# Altium schematic symbol library Diodes - TVS.SchLib: 5379 symbols (part 7 of 35) (continued)
## ESD5V0LB-TP (continued)
TVS DIODE 5V 16V DFN1006-2; Manufacturer: Micro Commercial Co; Bidirectional Channels: 1; Capacitance @ Frequency: 80pF @ 1MHz; Current - Peak Pulse (10/1000µs): 25A (8/20µs); Power Line Protection: No; Power - Peak Pulse: 400W; Type: Zener; Voltage - Breakdown (Min): 6V; Voltage - Reverse Standoff (Typ): 5V (Max); Part Number: ESD5V0LB-TP; Applications: General Purpose; ComponentLink1Description: Datasheet; ComponentLink1URL: https://www.mccsemi.com/pdf/Products/ESD5V0LB(DFN1006-2)-A.pdf; ComponentLink2Description: DigiKey Link; ComponentLink2URL: http://digikey.com/product-detail/en/micro-commercial-co/ESD5V0LB-TP/ESD5V0LB-TPMSCT-ND/6004815; Device Package: 0402 (1006 Metric); LastUpdated: 9/2/2020 1:28:49 AM; Lifecycle Status: Active; Minimum Order: 1; Mounting Type: Surface Mount; Operating Temperature: -55°C ~ 125°C (TJ); Package / Case: 0402 (1006 Metric); Packaging: TapeAndReel; PartId: 10502; Part Status: Active; Price: 0.03; Series: -; Supplier 1: DigiKey; Supplier Part Number 1: ESD5V0LB-TPMSCT-ND; Supplier Device Package: DFN1006-2; Voltage - Clamping (Max) @ Ipp: 16V
footprint 0402
pins: 1, 2

## ESD5V0S1U02VH6327XTSA1
designator D?
TVS DIODE 5V 14.5V SC79-2; Manufacturer: Infineon Technologies; Capacitance @ Frequency: 35pF @ 1MHz; Current - Peak Pulse (10/1000µs): 5.5A (8/20µs); Power Line Protection: No; Power - Peak Pulse: 66W; Type: Zener; Unidirectional Channels: 1; Voltage - Breakdown (Min): 5.7V; Voltage - Clamping (Max) @ Ipp: 14.5V (Typ); Voltage - Reverse Standoff (Typ): 5V (Max); Part Number: ESD5V0S1U02VH6327XTSA1; Applications: General Purpose; ComponentLink1Description: Datasheet; ComponentLink1URL: //media.digikey.com/pdf/Data%20Sheets/Infineon%20PDFs/ESD5V0S1U-02V.pdf; ComponentLink2Description: DigiKey Link; ComponentLink2URL: http://digikey.com/product-detail/en/infineon-technologies/ESD5V0S1U02VH6327XTSA1/ESD5V0S1U02VH6327XTSA1CT-ND/8416917; LastUpdated: 9/2/2020 1:28:24 AM; Lifecycle Status: Active; Minimum Order: 1; Mounting Type: Surface Mount; Operating Temperature: -55°C ~ 125°C (TJ); Package / Case: SC-79, SOD-523; Packaging: TapeAndReel; PartId: 9784; Part Status: Active; Price: 0.06; Series: -; Supplier 1: DigiKey; Supplier Part Number 1: ESD5V0S1U02VH6327XTSA1CT-ND; Supplier Device Package: PG-SC79-2
footprint SOD523F
pins: 1, 2

## ESD5Z2.5T1G
designator D?
TVS DIODE 2.5V 10.9V SOD523; Manufacturer: ON Semiconductor; Capacitance @ Frequency: 145pF @ 1MHz; Current - Peak Pulse (10/1000µs): 11A (8/20µs); Power Line Protection: No; Power - Peak Pulse: 120W; Type: Zener; Unidirectional Channels: 1; Voltage - Breakdown (Min): 4V; Voltage - Reverse Standoff (Typ): 2.5V (Max); Part Number: ESD5Z2.5T1G; Applications: General Purpose; ComponentLink1Description: Datasheet; ComponentLink1URL: https://www.onsemi.com/pub/Collateral/ESD5Z2.5T1-D.PDF; ComponentLink2Description: DigiKey Link; ComponentLink2URL: http://digikey.com/product-detail/en/on-semiconductor/ESD5Z2.5T1G/ESD5Z2.5T1GOSCT-ND/1967043; LastUpdated: 9/2/2020 1:28:24 AM; Lifecycle Status: Active; Minimum Order: 1; Mounting Type: Surface Mount; Operating Temperature: -55°C ~ 150°C (TJ); Package / Case: SC-79, SOD-523; Packaging: TapeAndReel; PartId: 9809; Part Status: Active; Price: 0.03; Series: -; Supplier 1: DigiKey; Supplier Part Number 1: ESD5Z2.5T1GOSCT-ND; Supplier Device Package: SOD-523; Voltage - Clamping (Max) @ Ipp: 10.9V
footprint SOD523F
pins: 1, 2

## ESD5Z2.5T5G
designator D?
TVS DIODE 2.5V 10.9V SOD523; Manufacturer: ON Semiconductor; Capacitance @ Frequency: 145pF @ 1MHz; Current - Peak Pulse (10/1000µs): 11A (8/20µs); Power Line Protection: No; Power - Peak Pulse: 120W; Type: Zener; Unidirectional Channels: 1; Voltage - Breakdown (Min): 4V; Voltage - Reverse Standoff (Typ): 2.5V (Max); Part Number: ESD5Z2.5T5G; Applications: General Purpose; ComponentLink1Description: Datasheet; ComponentLink1URL: https://www.onsemi.com/pub/Collateral/ESD5Z2.5T1-D.PDF; ComponentLink2Description: DigiKey Link; ComponentLink2URL: http://digikey.com/product-detail/en/on-semiconductor/ESD5Z2.5T5G/ESD5Z2.5T5GOSCT-ND/9086484; LastUpdated: 9/2/2020 1:28:24 AM; Lifecycle Status: Active; Minimum Order: 1; Mounting Type: Surface Mount; Operating Temperature: -55°C ~ 150°C (TJ); Package / Case: SC-79, SOD-523; Packaging: TapeAndReel; PartId: 9792; Part Status: Active; Price: 0.03; Series: -; Supplier 1: DigiKey; Supplier Part Number 1: ESD5Z2.5T5GOSCT-ND; Supplier Device Package: SOD-523; Voltage - Clamping (Max) @ Ipp: 10.9V
footprint SOD523F
pins: 1, 2

## ESD5Z3.3T1G
designator D?
TVS DIODE 3.3V 14.1V SOD523; Manufacturer: ON Semiconductor; Capacitance @ Frequency: 105pF @ 1MHz; Current - Peak Pulse (10/1000µs): 11.2A (8/20µs); Power Line Protection: No; Power - Peak Pulse: 158W; Type: Zener; Unidirectional Channels: 1; Voltage - Breakdown (Min): 5V; Voltage - Reverse Standoff (Typ): 3.3V (Max); Part Number: ESD5Z3.3T1G; Applications: General Purpose; ComponentLink1Description: Datasheet; ComponentLink1URL: https://www.onsemi.com/pub/Collateral/ESD5Z2.5T1-D.PDF; ComponentLink2Description: DigiKey Link; ComponentLink2URL: http://digikey.com/product-detail/en/on-semiconductor/ESD5Z3.3T1G/ESD5Z3.3T1GOSCT-ND/1967044; LastUpdated: 9/2/2020 1:28:24 AM; Lifecycle Status: Active; Minimum Order: 1; Mounting Type: Surface Mount; Operating Temperature: -55°C ~ 150°C (TJ); Package / Case: SC-79, SOD-523; Packaging: TapeAndReel; PartId: 9754; Part Status: Active; Price: 0.04; Series: -; Supplier 1: DigiKey; Supplier Part Number 1: ESD5Z3.3T1GOSCT-ND; Supplier Device Package: SOD-523; Voltage - Clamping (Max) @ Ipp: 14.1V
footprint SOD523F
pins: 1, 2

## ESD5Z3.3T5G
designator D?
TVS DIODE 3.3VWM 14.1VC SOD523; Manufacturer: ON Semiconductor; Capacitance @ Frequency: 105pF @ 1MHz; Current - Peak Pulse (10/1000µs): 11.2A (8/20µs); Power Line Protection: No; Power - Peak Pulse: 158W; Type: Zener; Unidirectional Channels: 1; Voltage - Breakdown (Min): 5V; Voltage - Clamping (Max) @ Ipp: 14.1V; Voltage - Reverse Standoff (Typ): 3.3V (Max); Part Number: ESD5Z3.3T5G; Applications: General Purpose; ComponentLink1Description: Datasheet; ComponentLink1URL: https://www.onsemi.com/pub/Collateral/ESD5Z2.5T1-D.PDF; ComponentLink2Description: DigiKey Link; ComponentLink2URL: http://digikey.com/product-detail/en/on-semiconductor/ESD5Z3.3T5G/ESD5Z3.3T5GOSCT-ND/8538421; LastUpdated: 9/2/2020 1:28:24 AM; Lifecycle Status: Active; Minimum Order: 1; Mounting Type: Surface Mount; Operating Temperature: -55°C ~ 150°C (TJ); Package / Case: SC-79, SOD-523; Packaging: TapeAndReel; PartId: 9806; Part Status: Active; Price: 0.03; Series: -; Supplier 1: DigiKey; Supplier Part Number 1: ESD5Z3.3T5GOSCT-ND; Supplier Device Package: SOD-523
footprint SOD523F
pins: 1, 2

## ESD5Z5.0T1G
designator D?
TVS DIODE 5V 18.6V SOD523; Manufacturer: ON Semiconductor; Capacitance @ Frequency: 80pF @ 1MHz; Current - Peak Pulse (10/1000µs): 9.4A (8/20µs); Power Line Protection: No; Power - Peak Pulse: 174W; Type: Zener; Unidirectional Channels: 1; Voltage - Breakdown (Min): 6.2V; Voltage - Reverse Standoff (Typ): 5V (Max); Part Number: ESD5Z5.0T1G; Applications: General Purpose; ComponentLink1Description: Datasheet; ComponentLink1URL: https://www.onsemi.com/pub/Collateral/ESD5Z2.5T1-D.PDF; ComponentLink2Description: DigiKey Link; ComponentLink2URL: http://digikey.com/product-detail/en/on-semiconductor/ESD5Z5.0T1G/ESD5Z5.0T1GOSCT-ND/1967045; LastUpdated: 9/2/2020 1:28:24 AM; Lifecycle Status: Active; Minimum Order: 1; Mounting Type: Surface Mount; Operating Temperature: -55°C ~ 150°C (TJ); Package / Case: SC-79, SOD-523; Packaging: TapeAndReel; PartId: 9755; Part Status: Active; Price: 0.04; Series: -; Supplier 1: DigiKey; Supplier Part Number 1: ESD5Z5.0T1GOSCT-ND; Supplier Device Package: SOD-523; Voltage - Clamping (Max) @ Ipp: 18.6V
footprint SOD523F
pins: 1, 2

## ESD5Z5.0T5G
designator D?
TVS DIODE 5V 18.6V SOD523; Manufacturer: ON Semiconductor; Capacitance @ Frequency: 80pF @ 1MHz; Current - Peak Pulse (10/1000µs): 9.4A (8/20µs); Power Line Protection: No; Power - Peak Pulse: 174W; Type: Zener; Unidirectional Channels: 1; Voltage - Breakdown (Min): 6.2V; Voltage - Reverse Standoff (Typ): 5V (Max); Part Number: ESD5Z5.0T5G; Applications: General Purpose; ComponentLink1Description: Datasheet; ComponentLink1URL: https://www.onsemi.com/pub/Collateral/ESD5Z2.5T1-D.PDF; ComponentLink2Description: DigiKey Link; ComponentLink2URL: http://digikey.com/product-detail/en/on-semiconductor/ESD5Z5.0T5G/ESD5Z5.0T5GOSCT-ND/9086485; LastUpdated: 9/2/2020 1:28:24 AM; Lifecycle Status: Active; Minimum Order: 1; Mounting Type: Surface Mount; Operating Temperature: -55°C ~ 150°C (TJ); Package / Case: SC-79, SOD-523; Packaging: TapeAndReel; PartId: 9791; Part Status: Active; Price: 0.03; Series: -; Supplier 1: DigiKey; Supplier Part Number 1: ESD5Z5.0T5GOSCT-ND; Supplier Device Package: SOD-523; Voltage - Clamping (Max) @ Ipp: 18.6V
footprint SOD523F
pins: 1, 2

## ESD5Z6.0T1G
designator D?
TVS DIODE 6V 20.5V SOD523; Manufacturer: ON Semiconductor; Capacitance @ Frequency: 70pF @ 1MHz; Current - Peak Pulse (10/1000µs): 8.8A (8/20µs); Power Line Protection: No; Power - Peak Pulse: 181W; Type: Zener; Unidirectional Channels: 1; Voltage - Breakdown (Min): 6.8V; Voltage - Reverse Standoff (Typ): 6V (Max); Part Number: ESD5Z6.0T1G; Applications: General Purpose; ComponentLink1Description: Datasheet; ComponentLink1URL: https://www.onsemi.com/pub/Collateral/ESD5Z2.5T1-D.PDF; ComponentLink2Description: DigiKey Link; ComponentLink2URL: http://digikey.com/product-detail/en/on-semiconductor/ESD5Z6.0T1G/ESD5Z6.0T1GOSCT-ND/1967046; LastUpdated: 9/2/2020 1:28:24 AM; Lifecycle Status: Active; Minimum Order: 1; Mounting Type: Surface Mount; Operating Temperature: -55°C ~ 150°C (TJ); Package / Case: SC-79, SOD-523; Packaging: TapeAndReel; PartId: 9804; Part Status: Active; Price: 0.04; Series: -; Supplier 1: DigiKey; Supplier Part Number 1: ESD5Z6.0T1GOSCT-ND; Supplier Device Package: SOD-523; Voltage - Clamping (Max) @ Ipp: 20.5V
footprint SOD523F
pins: 1, 2

## ESD5Z6.0T5G
designator D?
TVS DIODE 6V 20.5V SOD523; Manufacturer: ON Semiconductor; Capacitance @ Frequency: 70pF @ 1MHz; Current - Peak Pulse (10/1000µs): 8.8A (8/20µs); Power Line Protection: No; Power - Peak Pulse: 181W; Type: Zener; Unidirectional Channels: 1; Voltage - Breakdown (Min): 6.8V; Voltage - Reverse Standoff (Typ): 6V (Max); Part Number: ESD5Z6.0T5G; Applications: General Purpose; ComponentLink1Description: Datasheet; ComponentLink1URL: https://www.onsemi.com/pub/Collateral/ESD5Z2.5T1-D.PDF; ComponentLink2Description: DigiKey Link; ComponentLink2URL: http://digikey.com/product-detail/en/on-semiconductor/ESD5Z6.0T5G/ESD5Z6.0T5GOSCT-ND/9086486; LastUpdated: 9/2/2020 1:28:24 AM; Lifecycle Status: Active; Minimum Order: 1; Mounting Type: Surface Mount; Operating Temperature: -55°C ~ 150°C (TJ); Package / Case: SC-79, SOD-523; Packaging: TapeAndReel; PartId: 9807; Part Status: Active; Price: 0.03; Series: -; Supplier 1: DigiKey; Supplier Part Number 1: ESD5Z6.0T5GOSCT-ND; Supplier Device Package: SOD-523; Voltage - Clamping (Max) @ Ipp: 20.5V
footprint SOD523F
pins: 1, 2

## ESD5Z7.0T1G
designator D?
TVS DIODE 7V 22.7V SOD523; Manufacturer: ON Semiconductor; Capacitance @ Frequency: 65pF @ 1MHz; Current - Peak Pulse (10/1000µs): 8.8A (8/20µs); Power Line Protection: No; Power - Peak Pulse: 200W; Type: Zener; Unidirectional Channels: 1; Voltage - Breakdown (Min): 7.5V; Voltage - Reverse Standoff (Typ): 7V (Max); Part Number: ESD5Z7.0T1G; Applications: General Purpose; ComponentLink1Description: Datasheet; ComponentLink1URL: https://www.onsemi.com/pub/Collateral/ESD5Z2.5T1-D.PDF; ComponentLink2Description: DigiKey Link; ComponentLink2URL: http://digikey.com/product-detail/en/on-semiconductor/ESD5Z7.0T1G/ESD5Z7.0T1GOSCT-ND/2120622; LastUpdated: 9/2/2020 1:28:24 AM; Lifecycle Status: Active; Minimum Order: 1; Mounting Type: Surface Mount; Operating Temperature: -55°C ~ 150°C (TJ); Package / Case: SC-79, SOD-523; Packaging: TapeAndReel; PartId: 9808; Part Status: Active; Price: 0.03; Series: -; Supplier 1: DigiKey; Supplier Part Number 1: ESD5Z7.0T1GOSCT-ND; Supplier Device Package: SOD-523; Voltage - Clamping (Max) @ Ipp: 22.7V
footprint SOD523F
pins: 1, 2

## ESD5Z7.0T5G
designator D?
TVS DIODE 7V 22.7V SOD523; Manufacturer: ON Semiconductor; Capacitance @ Frequency: 65pF @ 1MHz; Current - Peak Pulse (10/1000µs): 8.8A (8/20µs); Power Line Protection: No; Power - Peak Pulse: 200W; Type: Zener; Unidirectional Channels: 1; Voltage - Breakdown (Min): 7.5V; Voltage - Reverse Standoff (Typ): 7V (Max); Part Number: ESD5Z7.0T5G; Applications: General Purpose; ComponentLink1Description: Datasheet; ComponentLink1URL: https://www.onsemi.com/pub/Collateral/ESD5Z2.5T1-D.PDF; ComponentLink2Description: DigiKey Link; ComponentLink2URL: http://digikey.com/product-detail/en/on-semiconductor/ESD5Z7.0T5G/ESD5Z7.0T5GOSCT-ND/9086487; LastUpdated: 9/2/2020 1:28:24 AM; Lifecycle Status: Active; Minimum Order: 1; Mounting Type: Surface Mount; Operating Temperature: -55°C ~ 150°C (TJ); Package / Case: SC-79, SOD-523; Packaging: CutTape; PartId: 9801; Part Status: Active; Price: 0.37; Series: -; Supplier 1: DigiKey; Supplier Part Number 1: ESD5Z7.0T5GOSCT-ND; Supplier Device Package: SOD-523; Voltage - Clamping (Max) @ Ipp: 22.7V
footprint SOD523F
pins: 1, 2

## ESD5Z12T1G
designator D?
TVS DIODE 12V 25V SOD523; Manufacturer: ON Semiconductor; Capacitance @ Frequency: 55pF @ 1MHz; Current - Peak Pulse (10/1000µs): 9.6A (8/20µs); Power Line Protection: No; Power - Peak Pulse: 240W; Type: Zener; Unidirectional Channels: 1; Voltage - Breakdown (Min): 14.1V; Voltage - Reverse Standoff (Typ): 12V (Max); Part Number: ESD5Z12T1G; Applications: General Purpose; ComponentLink1Description: Datasheet; ComponentLink1URL: https://www.onsemi.com/pub/Collateral/ESD5Z2.5T1-D.PDF; ComponentLink2Description: DigiKey Link; ComponentLink2URL: http://digikey.com/product-detail/en/on-semiconductor/ESD5Z12T1G/ESD5Z12T1GOSCT-ND/2120621; LastUpdated: 9/2/2020 1:28:24 AM; Lifecycle Status: Active; Minimum Order: 1; Mounting Type: Surface Mount; Operating Temperature: -55°C ~ 150°C (TJ); Package / Case: SC-79, SOD-523; Packaging: TapeAndReel; PartId: 9805; Part Status: Active; Price: 0.04; Series: -; Supplier 1: DigiKey; Supplier Part Number 1: ESD5Z12T1GOSCT-ND; Supplier Device Package: SOD-523; Voltage - Clamping (Max) @ Ipp: 25V
footprint SOD523F
pins: 1, 2

## ESD5Z12T5G
designator D?
TVS DIODE 12V 25V SOD523; Manufacturer: ON Semiconductor; Capacitance @ Frequency: 55pF @ 1MHz; Current - Peak Pulse (10/1000µs): 9.6A (8/20µs); Power Line Protection: No; Power - Peak Pulse: 240W; Type: Zener; Unidirectional Channels: 1; Voltage - Breakdown (Min): 14.1V; Voltage - Reverse Standoff (Typ): 12V (Max); Part Number: ESD5Z12T5G; Applications: General Purpose; ComponentLink1Description: Datasheet; ComponentLink1URL: https://www.onsemi.com/pub/Collateral/ESD5Z2.5T1-D.PDF; ComponentLink2Description: DigiKey Link; ComponentLink2URL: http://digikey.com/product-detail/en/on-semiconductor/ESD5Z12T5G/ESD5Z12T5GOSCT-ND/9086483; LastUpdated: 9/2/2020 1:28:23 AM; Lifecycle Status: Active; Minimum Order: 1; Mounting Type: Surface Mount; Operating Temperature: -55°C ~ 150°C (TJ); Package / Case: SC-79, SOD-523; Packaging: TapeAndReel; PartId: 9722; Part Status: Active; Price: 0.03; Series: -; Supplier 1: DigiKey; Supplier Part Number 1: ESD5Z12T5GOSCT-ND; Supplier Device Package: SOD-523; Voltage - Clamping (Max) @ Ipp: 25V
footprint SOD523F
pins: 1, 2

## ESD7V0D5-TP
designator D?
TVS DIODE 7V 22.7V SOD523; Manufacturer: Micro Commercial Co; Capacitance @ Frequency: 65pF @ 1MHz; Current - Peak Pulse (10/1000µs): 8.8A (8/20µs); Power Line Protection: No; Power - Peak Pulse: 200W; Type: Zener; Unidirectional Channels: 1; Voltage - Breakdown (Min): 7.5V; Voltage - Reverse Standoff (Typ): 7V (Max); Part Number: ESD7V0D5-TP; Applications: General Purpose; ComponentLink1Description: Datasheet; ComponentLink1URL: https://www.mccsemi.com/pdf/Products/ESD3V3D5-ESD12VD5(SOD-523).pdf; ComponentLink2Description: DigiKey Link; ComponentLink2URL: http://digikey.com/product-detail/en/micro-commercial-co/ESD7V0D5-TP/ESD7V0D5-TPMSCT-ND/1777010; LastUpdated: 9/2/2020 1:28:24 AM; Lifecycle Status: Active; Minimum Order: 1; Mounting Type: Surface Mount; Operating Temperature: -55°C ~ 150°C (TJ); Package / Case: SC-79, SOD-523; Packaging: TapeAndReel; PartId: 9781; Part Status: Active; Price: 0.06; Series: -; Supplier 1: DigiKey; Supplier Part Number 1: ESD7V0D5-TPMSCT-ND; Supplier Device Package: SOD-523; Voltage - Clamping (Max) @ Ipp: 22.7V
footprint SOD523F
pins: 1, 2

## ESD12VD3-TP
designator D?
TVS DIODE 12V 33V SOD323; Manufacturer: Micro Commercial Co; Capacitance @ Frequency: 150pF @ 1MHz; Current - Peak Pulse (10/1000µs): 15A (8/20µs); Power Line Protection: No; Power - Peak Pulse: 350W; Type: Zener; Unidirectional Channels: 1; Voltage - Breakdown (Min): 13.3V; Voltage - Reverse Standoff (Typ): 12V (Max); Part Number: ESD12VD3-TP; Applications: General Purpose; ComponentLink1Description: Datasheet; ComponentLink1URL: https://www.mccsemi.com/pdf/Products/ESD5V0D3-ESD12VD3(SOD-323).pdf; ComponentLink2Description: DigiKey Link; ComponentLink2URL: http://digikey.com/product-detail/en/micro-commercial-co/ESD12VD3-TP/ESD12VD3-TPMSCT-ND/1923301; LastUpdated: 9/2/2020 1:28:27 AM; Lifecycle Status: Active; Minimum Order: 1; Mounting Type: Surface Mount; Operating Temperature: -55°C ~ 150°C (TJ); Package / Case: SC-76, SOD-323; Packaging: TapeAndReel; PartId: 9880; Part Status: Active; Price: 0.06; Series: -; Supplier 1: DigiKey; Supplier Part Number 1: ESD12VD3-TPMSCT-ND; Supplier Device Package: SOD-323; Voltage - Clamping (Max) @ Ipp: 33V
footprint SOD323
pins: 1, 2

## ESD12VD3B-TP
designator D?
TVS DIODE 12V 15.5V SOD323; Manufacturer: Micro Commercial Co; Bidirectional Channels: 1; Capacitance @ Frequency: 80pF @ 1MHz; Current - Peak Pulse (10/1000µs): 1A (8/20µs); Power Line Protection: No; Power - Peak Pulse: 350W; Type: Zener; Voltage - Breakdown (Min): 13.5V; Voltage - Reverse Standoff (Typ): 12V (Max); Part Number: ESD12VD3B-TP; Applications: General Purpose; ComponentLink1Description: Datasheet; ComponentLink1URL: https://www.mccsemi.com/pdf/Products/ESD12VD3B(SOD-323).pdf; ComponentLink2Description: DigiKey Link; ComponentLink2URL: http://digikey.com/product-detail/en/micro-commercial-co/ESD12VD3B-TP/ESD12VD3B-TPMSCT-ND/2783889; LastUpdated: 9/2/2020 1:28:29 AM; Lifecycle Status: Active; Minimum Order: 1; Mounting Type: Surface Mount; Operating Temperature: -55°C ~ 150°C (TJ); Package / Case: SC-76, SOD-323; Packaging: TapeAndReel; PartId: 9922; Part Status: Active; Price: 0.11; Series: -; Supplier 1: DigiKey; Supplier Part Number 1: ESD12VD3B-TPMSCT-ND; Supplier Device Package: SOD-323; Voltage - Clamping (Max) @ Ipp: 15.5V
footprint SOD323
pins: 1, 2

## ESD12VD5-TP
designator D?
TVS DIODE 12V 25V SOD523; Manufacturer: Micro Commercial Co; Capacitance @ Frequency: 55pF @ 1MHz; Current - Peak Pulse (10/1000µs): 9.6A (8/20µs); Power Line Protection: No; Power - Peak Pulse: 240W; Type: Zener; Unidirectional Channels: 1; Voltage - Breakdown (Min): 14.1V; Voltage - Reverse Standoff (Typ): 12V (Max); Part Number: ESD12VD5-TP; Applications: General Purpose; ComponentLink1Description: Datasheet; ComponentLink1URL: https://www.mccsemi.com/pdf/Products/ESD3V3D5-ESD12VD5(SOD-523).pdf; ComponentLink2Description: DigiKey Link; ComponentLink2URL: http://digikey.com/product-detail/en/micro-commercial-co/ESD12VD5-TP/ESD12VD5-TPMSCT-ND/1777012; LastUpdated: 9/2/2020 1:28:24 AM; Lifecycle Status: Active; Minimum Order: 1; Mounting Type: Surface Mount; Operating Temperature: -55°C ~ 150°C (TJ); Package / Case: SC-79, SOD-523; Packaging: TapeAndReel; PartId: 9780; Part Status: Active; Price: 0.06; Series: -; Supplier 1: DigiKey; Supplier Part Number 1: ESD12VD5-TPMSCT-ND; Supplier Device Package: SOD-523; Voltage - Clamping (Max) @ Ipp: 25V
footprint SOD523F
pins: 1, 2

## ESD24VD5-TP
designator D?
ESDPROTECTIONDEVICESSOD-523; Manufacturer: Micro Commercial Co; Capacitance @ Frequency: 36pF @ 1MHz; Current - Peak Pulse (10/1000µs): 7.5A (8/20µs); Power Line Protection: No; Power - Peak Pulse: 330W; Type: Zener; Unidirectional Channels: 1; Voltage - Breakdown (Min): 26.7V; Voltage - Clamping (Max) @ Ipp: 44V; Voltage - Reverse Standoff (Typ): 24V (Max); Part Number: ESD24VD5-TP; Applications: General Purpose; ComponentLink1Description: Datasheet; ComponentLink1URL: https://www.mccsemi.com/pdf/Products/ESD24VD5(SOD-523)-V1.pdf; ComponentLink2Description: DigiKey Link; ComponentLink2URL: http://digikey.com/product-detail/en/micro-commercial-co/ESD24VD5-TP/ESD24VD5-TPMSCT-ND/10054349; LastUpdated: 9/2/2020 1:28:24 AM; Lifecycle Status: Active; Minimum Order: 1; Mounting Type: Surface Mount; Operating Temperature: -55°C ~ 150°C (TJ); Package / Case: SC-79, SOD-523; Packaging: TapeAndReel; PartId: 9798; Part Status: Active; Price: 0.07; Series: -; Supplier 1: DigiKey; Supplier Part Number 1: ESD24VD5-TPMSCT-ND; Supplier Device Package: SOD-523
footprint SOD523F
pins: 1, 2

## ESD24VLB-TP
designator D?
VARISTOR 24V DFN1006-2; Manufacturer: Micro Commercial Co; Bidirectional Channels: 1; Capacitance @ Frequency: 20pF @ 1MHz (Max); Current - Peak Pulse (10/1000µs): 5A (8/20µs); Power Line Protection: No; Power - Peak Pulse: 300W; Type: Zener; Voltage - Breakdown (Min): 27V; Voltage - Clamping (Max) @ Ipp: 40V; Voltage - Reverse Standoff (Typ): 24V (Max); Part Number: ESD24VLB-TP; Applications: General Purpose; ComponentLink1Description: Datasheet; ComponentLink1URL: https://www.mccsemi.com/pdf/Products/ESD24VLB(DFN1006-2)-V1.pdf; ComponentLink2Description: DigiKey Link; ComponentLink2URL: http://digikey.com/product-detail/en/micro-commercial-co/ESD24VLB-TP/ESD24VLB-TPMSCT-ND/10054457; Device Package: 0402 (1006 Metric); LastUpdated: 9/2/2020 1:28:49 AM; Lifecycle Status: Active; Minimum Order: 1; Mounting Type: Surface Mount; Operating Temperature: -55°C ~ 125°C (TJ); Package / Case: 0402 (1006 Metric); Packaging: TapeAndReel; PartId: 10481; Part Status: Active; Price: 0.06; Series: -; Supplier 1: DigiKey; Supplier Part Number 1: ESD24VLB-TPMSCT-ND; Supplier Device Package: DFN1006-2
footprint 0402
pins: 1, 2

## ESD133CTR
designator D?
33V STEERING DIODE,PACKAGE DFN10; Manufacturer: SMC Diode Solutions; Bidirectional Channels: 1; Capacitance @ Frequency: 12pF @ 1MHz; Current - Peak Pulse (10/1000µs): 4A (8/20µs); Power Line Protection: No; Type: Zener; Voltage - Breakdown (Min): 35V; Voltage - Clamping (Max) @ Ipp: 60V; Voltage - Reverse Standoff (Typ): 33V (Max); Part Number: ESD133CTR; Applications: General Purpose; ComponentLink1Description: Datasheet; ComponentLink1URL: http://www.smc-diodes.com/propdf/ESD133C%20N2233%20REV.B.pdf; ComponentLink2Description: DigiKey Link; ComponentLink2URL: http://digikey.com/product-detail/en/smc-diode-solutions/ESD133CTR/1655-ESD133CCT-ND/12173926; LastUpdated: 8/30/2020 9:08:11 PM; Lifecycle Status: Active; Minimum Order: 1; Mounting Type: Surface Mount; Operating Temperature: -55°C ~ 85°C (TA); Package / Case: 0402 (1006 Metric); Packaging: Unknown; PartId: 11497; Price: 0.03; Series: ESD133C; Supplier 1: DigiKey; Supplier Part Number 1: 1655-ESD133CCT-ND; Supplier Device Package: DFN1006-2L
footprint 0402
pins: 1, 2

## ESD351DPYR
designator D?
GENERAL PURPOSE ESD PROTECTION; Manufacturer: Texas Instruments; Capacitance @ Frequency: 1.8pF @ 1MHz; Current - Peak Pulse (10/1000µs): 16A; Power Line Protection: No; Power - Peak Pulse: 36W; Type: Zener; Unidirectional Channels: 1; Voltage - Breakdown (Min): 4.5V; Voltage - Clamping (Max) @ Ipp: 6.5V; Voltage - Reverse Standoff (Typ): 3.6V; Part Number: ESD351DPYR; Applications: General Purpose; ComponentLink1Description: Datasheet; ComponentLink1URL: http://www.ti.com/general/docs/suppproductinfo.tsp?distId=10&gotoUrl=http%3A%2F%2Fwww.ti.com%2Flit%2Fgpn%2Fesd351; ComponentLink2Description: DigiKey Link; ComponentLink2URL: http://digikey.com/product-detail/en/texas-instruments/ESD351DPYR/296-51109-1-ND/9745473; Device Package: 0402 (1006 Metric); LastUpdated: 9/2/2020 1:28:45 AM; Lifecycle Status: Active; Minimum Order: 1; Mounting Type: Surface Mount; Operating Temperature: -40°C ~ 125°C; Package / Case: 0402 (1006 Metric); Packaging: TapeAndReel; PartId: 10376; Part Status: Active; Price: 0.10; Series: -; Supplier 1: DigiKey; Supplier Part Number 1: 296-51109-1-ND; Supplier Device Package: 2-X1SON (1x.60)
footprint 0402
pins: 1, 2

## ESD401DPYR
designator D?
TVS DIODE 5.5V 24V 2X1SON; Manufacturer: Texas Instruments; Bidirectional Channels: 1; Current - Peak Pulse (10/1000µs): 4.5A (8/20µs); Power Line Protection: No; Power - Peak Pulse: 67W; Type: Zener; Voltage - Breakdown (Min): 7.5V; Voltage - Clamping (Max) @ Ipp: 24V (Typ); Voltage - Reverse Standoff (Typ): 5.5V (Max); Part Number: ESD401DPYR; Applications: General Purpose; ComponentLink1Description: Datasheet; ComponentLink1URL: http://www.ti.com/general/docs/suppproductinfo.tsp?distId=10&gotoUrl=http%3A%2F%2Fwww.ti.com%2Flit%2Fgpn%2Fesd401; ComponentLink2Description: DigiKey Link; ComponentLink2URL: http://digikey.com/product-detail/en/texas-instruments/ESD401DPYR/296-47160-1-ND/7650254; Device Package: 0402 (1006 Metric); LastUpdated: 9/2/2020 1:28:49 AM; Lifecycle Status: Active; Minimum Order: 1; Mounting Type: Surface Mount; Operating Temperature: -40°C ~ 125°C (TA); Package / Case: 0402 (1006 Metric); Packaging: TapeAndReel; PartId: 10459; Part Status: Active; Price: 0.12; Series: -; Supplier 1: DigiKey; Supplier Part Number 1: 296-47160-1-ND; Supplier Device Package: 2-X1SON (1x.60)
footprint 0402
pins: 1, 2

## ESD0512LB-TP
designator D?
5V, ESD PROTECTION DEVICES, DFN1; Manufacturer: Micro Commercial Co; Bidirectional Channels: 1; Capacitance @ Frequency: 30pF @ 1MHz; Current - Peak Pulse (10/1000µs): 10A (8/20µs); Power Line Protection: No; Power - Peak Pulse: 200W; Type: Zener; Voltage - Breakdown (Min): 11V; Voltage - Clamping (Max) @ Ipp: 20V (Typ); Voltage - Reverse Standoff (Typ): 5V (Max); Part Number: ESD0512LB-TP; Applications: General Purpose; ComponentLink2Description: DigiKey Link; ComponentLink2URL: http://digikey.com/product-detail/en/micro-commercial-co/ESD0512LB-TP/353-ESD0512LB-TPCT-ND/12177322; LastUpdated: 8/30/2020 9:08:11 PM; Lifecycle Status: Active; Minimum Order: 1; Mounting Type: Surface Mount; Package / Case: 0402 (1006 Metric); Packaging: Unknown; PartId: 11466; Price: 0.03; Supplier 1: DigiKey; Supplier Part Number 1: 353-ESD0512LB-TPCT-ND; Supplier Device Package: DFN1006-2
footprint 0402
pins: 1, 2

## ESD1524D3B-TP
designator D?
15V, ESD PROTECTION DEVICES, SOD; Manufacturer: Micro Commercial Co; Bidirectional Channels: 1; Capacitance @ Frequency: 13pF @ 1MHz (Max); Current - Peak Pulse (10/1000µs): 5A (8/20µs); Power Line Protection: No; Power - Peak Pulse: 160W; Type: Zener; Voltage - Breakdown (Min): 17.1V; Voltage - Clamping (Max) @ Ipp: 35V; Voltage - Reverse Standoff (Typ): 15V (Max); Part Number: ESD1524D3B-TP; Applications: General Purpose; ComponentLink2Description: DigiKey Link; ComponentLink2URL: http://digikey.com/product-detail/en/micro-commercial-co/ESD1524D3B-TP/353-ESD1524D3B-TPDKR-ND/12177326; LastUpdated: 8/30/2020 9:07:52 PM; Lifecycle Status: Active; Minimum Order: 1; Mounting Type: Surface Mount; Package / Case: SC-76, SOD-323; Packaging: Unknown; PartId: 11457; Price: 0.06; Supplier 1: DigiKey; Supplier Part Number 1: 353-ESD1524D3B-TPDKR-ND; Supplier Device Package: SOD-323
footprint SOD323
pins: 1, 2

## ESD7351HT1G
designator D?
TVS DIODE 3.3V SOD323; Manufacturer: ON Semiconductor; Capacitance @ Frequency: 0.43pF @ 1MHz; Power Line Protection: No; Type: Zener; Unidirectional Channels: 1; Voltage - Breakdown (Min): 5V; Voltage - Reverse Standoff (Typ): 3.3V (Max); Part Number: ESD7351HT1G; Applications: RF Antenna; ComponentLink1Description: Datasheet; ComponentLink1URL: http://www.onsemi.com/pub/Collateral/ESD7351-D.PDF; ComponentLink2Description: DigiKey Link; ComponentLink2URL: http://digikey.com/product-detail/en/on-semiconductor/ESD7351HT1G/ESD7351HT1GOSCT-ND/9086491; LastUpdated: 9/2/2020 1:28:27 AM; Lifecycle Status: Active; Minimum Order: 1; Mounting Type: Surface Mount; Operating Temperature: -55°C ~ 150°C (TJ); Package / Case: SC-76, SOD-323; Packaging: TapeAndReel; PartId: 9870; Part Status: Active; Price: 0.08; Series: -; Supplier 1: DigiKey; Supplier Part Number 1: ESD7351HT1GOSCT-ND; Supplier Device Package: SOD-323
footprint SOD323
pins: 1, 2

## ESD7351XV2T1G
designator D?
TVS DIODE 3.3VWM SOD-523-2; Manufacturer: ON Semiconductor; Capacitance @ Frequency: 0.43pF @ 1MHz; Power Line Protection: No; Type: Zener; Unidirectional Channels: 1; Voltage - Breakdown (Min): 5V; Voltage - Reverse Standoff (Typ): 3.3V (Max); Part Number: ESD7351XV2T1G; Applications: RF Antenna; ComponentLink1Description: Datasheet; ComponentLink1URL: http://www.onsemi.com/pub/Collateral/ESD7351-D.PDF; ComponentLink2Description: DigiKey Link; ComponentLink2URL: http://digikey.com/product-detail/en/on-semiconductor/ESD7351XV2T1G/ESD7351XV2T1GOSCT-ND/8538424; LastUpdated: 9/2/2020 1:28:24 AM; Lifecycle Status: Active; Minimum Order: 1; Mounting Type: Surface Mount; Operating Temperature: -55°C ~ 150°C (TJ); Package / Case: SC-79, SOD-523; Packaging: TapeAndReel; PartId: 9782; Part Status: Active; Price: 0.05; Series: -; Supplier 1: DigiKey; Supplier Part Number 1: ESD7351XV2T1GOSCT-ND; Supplier Device Package: SOD-523
footprint SOD523F
pins: 1, 2

## ESD7361HT1G
designator D?
TVS DIODE 5VWM 34VC SOD-323; Manufacturer: ON Semiconductor; Capacitance @ Frequency: 0.55pF @ 1MHz; Current - Peak Pulse (10/1000µs): 16A (100ns); Power Line Protection: No; Type: Zener; Unidirectional Channels: 1; Voltage - Breakdown (Min): 16.5V; Voltage - Clamping (Max) @ Ipp: 34V (Typ); Voltage - Reverse Standoff (Typ): 5V; Part Number: ESD7361HT1G; Applications: General Purpose; ComponentLink1Description: Datasheet; ComponentLink1URL: http://www.onsemi.com/pub/Collateral/ESD7361-D.PDF; ComponentLink2Description: DigiKey Link; ComponentLink2URL: http://digikey.com/product-detail/en/on-semiconductor/ESD7361HT1G/ESD7361HT1GOSCT-ND/8538425; LastUpdated: 9/2/2020 1:28:26 AM; Lifecycle Status: Active; Minimum Order: 1; Mounting Type: Surface Mount; Operating Temperature: -55°C ~ 125°C (TJ); Package / Case: SC-76, SOD-323; Packaging: TapeAndReel; PartId: 9849; Part Status: Active; Price: 0.09; Series: -; Supplier 1: DigiKey; Supplier Part Number 1: ESD7361HT1GOSCT-ND; Supplier Device Package: SOD-323
footprint SOD323
pins: 1, 2

## ESD7361XV2T1G
designator D?
TVS DIODE 5V 34V SOD523; Manufacturer: ON Semiconductor; Capacitance @ Frequency: 0.55pF @ 1MHz; Current - Peak Pulse (10/1000µs): 16A (100ns); Power Line Protection: No; Type: Zener; Unidirectional Channels: 1; Voltage - Breakdown (Min): 16.5V; Voltage - Clamping (Max) @ Ipp: 34V (Typ); Part Number: ESD7361XV2T1G; Applications: General Purpose; ComponentLink1Description: Datasheet; ComponentLink1URL: http://www.onsemi.com/pub/Collateral/ESD7361-D.PDF; ComponentLink2Description: DigiKey Link; ComponentLink2URL: http://digikey.com/product-detail/en/on-semiconductor/ESD7361XV2T1G/ESD7361XV2T1GOSCT-ND/9086493; LastUpdated: 9/2/2020 1:28:24 AM; Lifecycle Status: Active; Minimum Order: 1; Mounting Type: Surface Mount; Operating Temperature: -55°C ~ 125°C (TJ); Package / Case: SC-79, SOD-523; Packaging: TapeAndReel; PartId: 9760; Part Status: Active; Price: 0.09; Series: -; Supplier 1: DigiKey; Supplier Part Number 1: ESD7361XV2T1GOSCT-ND; Supplier Device Package: SOD-523; Voltage - Reverse Standoff (Typ): 5V
footprint SOD523F
pins: 1, 2

## ESD7371HT1G
designator D?
TVS DIODE 5.3V SOD323; Manufacturer: ON Semiconductor; Capacitance @ Frequency: 0.43pF @ 1MHz; Power Line Protection: No; Type: Zener; Unidirectional Channels: 1; Voltage - Breakdown (Min): 7V; Voltage - Reverse Standoff (Typ): 5.3V (Max); Part Number: ESD7371HT1G; Applications: RF Antenna; ComponentLink1Description: Datasheet; ComponentLink1URL: http://www.onsemi.com/pub/Collateral/ESD7371-D.PDF; ComponentLink2Description: DigiKey Link; ComponentLink2URL: http://digikey.com/product-detail/en/on-semiconductor/ESD7371HT1G/ESD7371HT1GOSCT-ND/5969220; LastUpdated: 9/2/2020 1:28:27 AM; Lifecycle Status: Active; Minimum Order: 1; Mounting Type: Surface Mount; Operating Temperature: -55°C ~ 150°C (TJ); Package / Case: SC-76, SOD-323; Packaging: TapeAndReel; PartId: 9877; Part Status: Active; Price: 0.08; Series: -; Supplier 1: DigiKey; Supplier Part Number 1: ESD7371HT1GOSCT-ND; Supplier Device Package: SOD-323
footprint SOD323
pins: 1, 2

## ESD7371XV2T1G
designator D?
TVS DIODE 5.3VWM SOD-523-2; Manufacturer: ON Semiconductor; Capacitance @ Frequency: 0.43pF @ 1MHz; Power Line Protection: No; Type: Zener; Unidirectional Channels: 1; Voltage - Breakdown (Min): 7V; Voltage - Reverse Standoff (Typ): 5.3V (Max); Part Number: ESD7371XV2T1G; Applications: RF Antenna; ComponentLink1Description: Datasheet; ComponentLink1URL: http://www.onsemi.com/pub/Collateral/ESD7371-D.PDF; ComponentLink2Description: DigiKey Link; ComponentLink2URL: http://digikey.com/product-detail/en/on-semiconductor/ESD7371XV2T1G/ESD7371XV2T1GOSCT-ND/8538427; LastUpdated: 9/2/2020 1:28:24 AM; Lifecycle Status: Active; Minimum Order: 1; Mounting Type: Surface Mount; Operating Temperature: -55°C ~ 150°C (TJ); Package / Case: SC-79, SOD-523; Packaging: TapeAndReel; PartId: 9783; Part Status: Active; Price: 0.05; Series: -; Supplier 1: DigiKey; Supplier Part Number 1: ESD7371XV2T1GOSCT-ND; Supplier Device Package: SOD-523
footprint SOD523F
pins: 1, 2

## ESD8351HT1G
designator D?
TVS DIODE 3.3VWM 11.2VC SOD323; Manufacturer: ON Semiconductor; Capacitance @ Frequency: 0.37pF @ 1MHz; Current - Peak Pulse (10/1000µs): 5A (8/20µs); Power Line Protection: No; Type: Zener; Unidirectional Channels: 1; Voltage - Breakdown (Min): 5.5V; Voltage - Clamping (Max) @ Ipp: 11.2V; Voltage - Reverse Standoff (Typ): 3.3V (Max); Part Number: ESD8351HT1G; Applications: General Purpose; ComponentLink1Description: Datasheet; ComponentLink1URL: http://www.onsemi.com/pub/Collateral/ESD8351-D.PDF; ComponentLink2Description: DigiKey Link; ComponentLink2URL: http://digikey.com/product-detail/en/on-semiconductor/ESD8351HT1G/ESD8351HT1GOSCT-ND/8538432; LastUpdated: 9/2/2020 1:28:26 AM; Lifecycle Status: Active; Minimum Order: 1; Mounting Type: Surface Mount; Operating Temperature: -55°C ~ 125°C (TJ); Package / Case: SC-76, SOD-323; Packaging: TapeAndReel; PartId: 9840; Part Status: Active; Price: 0.06; Series: -; Supplier 1: DigiKey; Supplier Part Number 1: ESD8351HT1GOSCT-ND; Supplier Device Package: SOD-323
footprint SOD323
pins: 1, 2

## ESD8351XV2T1G
designator D?
TVS DIODE 3.3V 11.2V SOD523; Manufacturer: ON Semiconductor; Capacitance @ Frequency: 0.37pF @ 1MHz; Current - Peak Pulse (10/1000µs): 5A (8/20µs); Power Line Protection: No; Type: Zener; Unidirectional Channels: 1; Voltage - Breakdown (Min): 5.5V; Voltage - Reverse Standoff (Typ): 3.3V (Max); Part Number: ESD8351XV2T1G; Applications: General Purpose; ComponentLink1Description: Datasheet; ComponentLink1URL: http://www.onsemi.com/pub/Collateral/ESD8351-D.PDF; ComponentLink2Description: DigiKey Link; ComponentLink2URL: http://digikey.com/product-detail/en/on-semiconductor/ESD8351XV2T1G/ESD8351XV2T1GOSCT-ND/6007832; LastUpdated: 9/2/2020 1:28:24 AM; Lifecycle Status: Active; Minimum Order: 1; Mounting Type: Surface Mount; Operating Temperature: -55°C ~ 125°C (TJ); Package / Case: SC-79, SOD-523; Packaging: TapeAndReel; PartId: 9786; Part Status: Active; Price: 0.06; Series: -; Supplier 1: DigiKey; Supplier Part Number 1: ESD8351XV2T1GOSCT-ND; Supplier Device Package: SOD-523; Voltage - Clamping (Max) @ Ipp: 11.2V
footprint SOD523F
pins: 1, 2

## ESDA8V2-1J
designator D?
TVS DIODE 5V 20V SOD323; Manufacturer: STMicroelectronics; Capacitance @ Frequency: 210pF @ 1MHz; Current - Peak Pulse (10/1000µs): 25A (8/20µs); Power Line Protection: No; Power - Peak Pulse: 500W; Type: Zener; Unidirectional Channels: 1; Voltage - Breakdown (Min): 8.2V; Part Number: ESDA8V2-1J; Applications: General Purpose; ComponentLink1Description: Datasheet; ComponentLink1URL: http://www.st.com/content/ccc/resource/technical/document/datasheet/fc/e4/b8/75/43/a8/49/11/CD00233088.pdf/files/CD00233088.pdf/jcr:content/translations/en.CD00233088.pdf; ComponentLink2Description: DigiKey Link; ComponentLink2URL: http://digikey.com/product-detail/en/stmicroelectronics/ESDA8V2-1J/497-10893-1-ND/2522513; LastUpdated: 9/2/2020 1:28:27 AM; Lifecycle Status: Active; Minimum Order: 1; Mounting Type: Surface Mount; Operating Temperature: -40°C ~ 125°C (TJ); Package / Case: SC-76, SOD-323; Packaging: TapeAndReel; PartId: 9881; Part Status: Active; Price: 0.06; Series: ESDA, TRANSIL™; Supplier 1: DigiKey; Supplier Part Number 1: 497-10893-1-ND; Supplier Device Package: SOD-323; Voltage - Clamping (Max) @ Ipp: 20V; Voltage - Reverse Standoff (Typ): 5V
footprint SOD323
pins: 1, 2

## ESDA12-1K
designator D?
TVS DIODE 10V 28V SOD523; Manufacturer: STMicroelectronics; Capacitance @ Frequency: 150pF @ 1MHz; Current - Peak Pulse (10/1000µs): 16A (8/20µs); Power Line Protection: No; Power - Peak Pulse: 450W; Type: Zener; Unidirectional Channels: 1; Voltage - Breakdown (Min): 12V; Part Number: ESDA12-1K; Applications: General Purpose; ComponentLink1Description: Datasheet; ComponentLink1URL: http://www.st.com/content/ccc/resource/technical/document/datasheet/e5/70/51/55/b8/1a/41/8f/CD00283838.pdf/files/CD00283838.pdf/jcr:content/translations/en.CD00283838.pdf; ComponentLink2Description: DigiKey Link; ComponentLink2URL: http://digikey.com/product-detail/en/stmicroelectronics/ESDA12-1K/497-10766-1-ND/2440285; LastUpdated: 9/2/2020 1:28:24 AM; Lifecycle Status: Active; Minimum Order: 1; Mounting Type: Surface Mount; Operating Temperature: -40°C ~ 150°C (TJ); Package / Case: SC-79, SOD-523; Packaging: TapeAndReel; PartId: 9756; Part Status: Active; Price: 0.08; Series: ESDA, TRANSIL™; Supplier 1: DigiKey; Supplier Part Number 1: 497-10766-1-ND; Supplier Device Package: SOD-523; Voltage - Clamping (Max) @ Ipp: 28V; Voltage - Reverse Standoff (Typ): 10V
footprint SOD523F
pins: 1, 2

## ESDA18-1K
designator D?
TVS DIODE 15V 34V SOD523; Manufacturer: STMicroelectronics; Capacitance @ Frequency: 105pF @ 1MHz; Current - Peak Pulse (10/1000µs): 12A (8/20µs); Power Line Protection: No; Power - Peak Pulse: 400W; Type: Zener; Unidirectional Channels: 1; Voltage - Breakdown (Min): 18V; Part Number: ESDA18-1K; Applications: General Purpose; ComponentLink1Description: Datasheet; ComponentLink1URL: http://www.st.com/content/ccc/resource/technical/document/datasheet/e5/70/51/55/b8/1a/41/8f/CD00283838.pdf/files/CD00283838.pdf/jcr:content/translations/en.CD00283838.pdf; ComponentLink2Description: DigiKey Link; ComponentLink2URL: http://digikey.com/product-detail/en/stmicroelectronics/ESDA18-1K/497-10767-1-ND/2440286; LastUpdated: 9/2/2020 1:28:24 AM; Lifecycle Status: Active; Minimum Order: 1; Mounting Type: Surface Mount; Operating Temperature: -40°C ~ 150°C (TJ); Package / Case: SC-79, SOD-523; Packaging: TapeAndReel; PartId: 9770; Part Status: Active; Price: 0.08; Series: ESDA, TRANSIL™; Supplier 1: DigiKey; Supplier Part Number 1: 497-10767-1-ND; Supplier Device Package: SOD-523; Voltage - Clamping (Max) @ Ipp: 34V; Voltage - Reverse Standoff (Typ): 15V
footprint SOD523F
pins: 1, 2

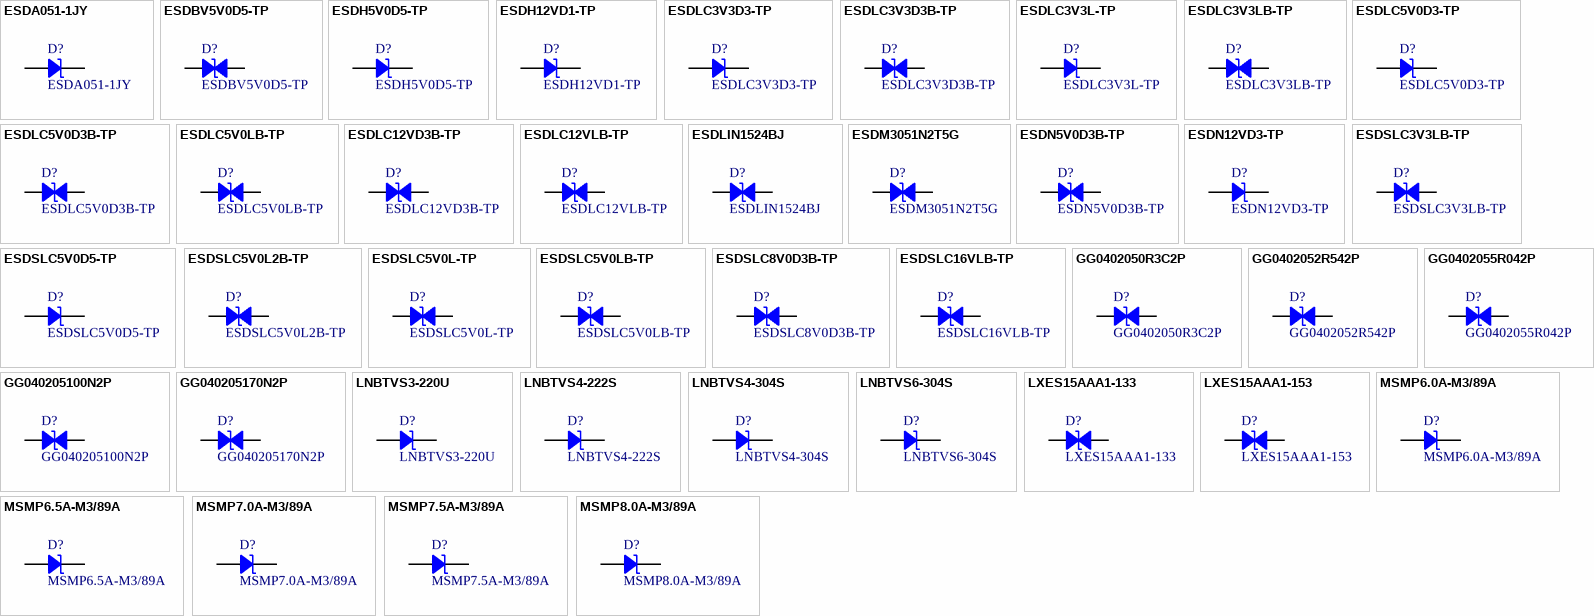
[diagram p25: symbols ESDA051-1JY to MSMP8.0A-M3/89A]

## ESDA051-1JY
designator D?
AUTOMOTIVE SINGLE LINE 5V TVS IN; Manufacturer: STMicroelectronics; Current - Peak Pulse (10/1000µs): 20A (8/20µs); Power Line Protection: No; Type: Zener; Unidirectional Channels: 1; Voltage - Breakdown (Min): 6.2V; Voltage - Clamping (Max) @ Ipp: 12.8V; Voltage - Reverse Standoff (Typ): 5V (Max); Part Number: ESDA051-1JY; Applications: Automotive; ComponentLink2Description: DigiKey Link; ComponentLink2URL: http://digikey.com/product-detail/en/stmicroelectronics/ESDA051-1JY/497-ESDA051-1JYCT-ND/11686353; LastUpdated: 8/30/2020 9:07:50 PM; Lifecycle Status: Active; Minimum Order: 1; Mounting Type: Surface Mount; Operating Temperature: -55°C ~ 150°C (TJ); Package / Case: SC-76, SOD-323; Packaging: TapeAndReel; PartId: 11456; Price: 0.05; Series: Automotive, AEC-Q101, ESDA; Supplier 1: DigiKey; Supplier Part Number 1: 497-ESDA051-1JYCT-ND; Supplier Device Package: SOD-323
footprint SOD323
pins: 1, 2
